# Altium integrated library WCAP-ATLL_rev15a.intlib: 209 symbols (part 2 of 3) (continued)
## WCAP-ATLL 8x16x3.5x0.5 860160574017
designator C?, comment 180 μF
WCAP-ATLL Aluminum Electrolytic Capacitors , 180 μF; + / - 20%; 35 V , 8 x 16; Manufacturer: Wurth Elektronik; partNo: 860160574017; E-mail: libraries@we-online.com; Characteristics: Aluminum Electrolytic Capacitor;Recommended soldering: Wave;Operating temperature: –55 °C to +105 °C;Low impedance and high temperature product series;Load life: 3000–10000 h @ +105 °C; ComponentLink1Description: Manufacturer; ComponentLink1URL: http://www.we-online.com; ComponentLink2Description: Datasheet; ComponentLink2URL: http://katalog.we-online.de/pbs/datasheet/860160574017.pdf; Created by: Karrer Zheng; Created Date: 5/13/2015; Capacitance: 180 μF; Application: Used in circuit with rigorous conditions and high ambient temperature;  applied to the secondary side output filtering loop, used in switching power supply with higher operating temperature, DC-DC converter, AC-DC converter, adapter, charger, TV, VCR, DC motor circuit filter, high-end switching power supply, LCD TV, energy saving lamps, electronic ballast, LED lamp and etc.
footprint WCAP-ATLL 8x16x3.5x0.5
pins: 1, 2

## WCAP-ATLL 8x16x3.5x0.5 860160574019
designator C?, comment 220 μF
WCAP-ATLL Aluminum Electrolytic Capacitors , 220 μF; + / - 20%; 35 V , 8 x 16; Manufacturer: Wurth Elektronik; partNo: 860160574019; E-mail: libraries@we-online.com; Characteristics: Aluminum Electrolytic Capacitor;Recommended soldering: Wave;Operating temperature: –55 °C to +105 °C;Low impedance and high temperature product series;Load life: 3000–10000 h @ +105 °C; ComponentLink1Description: Manufacturer; ComponentLink1URL: http://www.we-online.com; ComponentLink2Description: Datasheet; ComponentLink2URL: http://katalog.we-online.de/pbs/datasheet/860160574019.pdf; Created by: Karrer Zheng; Created Date: 5/13/2015; Capacitance: 220 μF; Application: Used in circuit with rigorous conditions and high ambient temperature;  applied to the secondary side output filtering loop, used in switching power supply with higher operating temperature, DC-DC converter, AC-DC converter, adapter, charger, TV, VCR, DC motor circuit filter, high-end switching power supply, LCD TV, energy saving lamps, electronic ballast, LED lamp and etc.
footprint WCAP-ATLL 8x16x3.5x0.5
pins: 1, 2

## WCAP-ATLL 8x20x3.5x0.6 860160574021
designator C?, comment 270 μF
WCAP-ATLL Aluminum Electrolytic Capacitors , 270 μF; + / - 20%; 35 V , 8 x 20; Manufacturer: Wurth Elektronik; partNo: 860160574021; E-mail: libraries@we-online.com; Characteristics: Aluminum Electrolytic Capacitor;Recommended soldering: Wave;Operating temperature: –55 °C to +105 °C;Low impedance and high temperature product series;Load life: 3000–10000 h @ +105 °C; ComponentLink1Description: Manufacturer; ComponentLink1URL: http://www.we-online.com; ComponentLink2Description: Datasheet; ComponentLink2URL: http://katalog.we-online.de/pbs/datasheet/860160574021.pdf; Created by: Karrer Zheng; Created Date: 5/13/2015; Capacitance: 270 μF; Application: Used in circuit with rigorous conditions and high ambient temperature;  applied to the secondary side output filtering loop, used in switching power supply with higher operating temperature, DC-DC converter, AC-DC converter, adapter, charger, TV, VCR, DC motor circuit filter, high-end switching power supply, LCD TV, energy saving lamps, electronic ballast, LED lamp and etc.
footprint WCAP-ATLL 8x20x3.5x0.6
pins: 1, 2

## WCAP-ATLL 8x20x3.5x0.6 860160574023
designator C?, comment 330 μF
WCAP-ATLL Aluminum Electrolytic Capacitors , 330 μF; + / - 20%; 35 V , 8 x 20; Manufacturer: Wurth Elektronik; partNo: 860160574023; E-mail: libraries@we-online.com; Characteristics: Aluminum Electrolytic Capacitor;Recommended soldering: Wave;Operating temperature: –55 °C to +105 °C;Low impedance and high temperature product series;Load life: 3000–10000 h @ +105 °C; ComponentLink1Description: Manufacturer; ComponentLink1URL: http://www.we-online.com; ComponentLink2Description: Datasheet; ComponentLink2URL: http://katalog.we-online.de/pbs/datasheet/860160574023.pdf; Created by: Karrer Zheng; Created Date: 5/13/2015; Capacitance: 330 μF; Application: Used in circuit with rigorous conditions and high ambient temperature;  applied to the secondary side output filtering loop, used in switching power supply with higher operating temperature, DC-DC converter, AC-DC converter, adapter, charger, TV, VCR, DC motor circuit filter, high-end switching power supply, LCD TV, energy saving lamps, electronic ballast, LED lamp and etc.
footprint WCAP-ATLL 8x20x3.5x0.6
pins: 1, 2

## WCAP-ATLL 10x12.5x5x0.6 860160575016
designator C?, comment 150 μF
WCAP-ATLL Aluminum Electrolytic Capacitors , 150 μF; + / - 20%; 35 V , 10 x 12,5; Manufacturer: Wurth Elektronik; partNo: 860160575016; E-mail: libraries@we-online.com; Characteristics: Aluminum Electrolytic Capacitor;Recommended soldering: Wave;Operating temperature: –55 °C to +105 °C;Low impedance and high temperature product series;Load life: 3000–10000 h @ +105 °C; ComponentLink1Description: Manufacturer; ComponentLink1URL: http://www.we-online.com; ComponentLink2Description: Datasheet; ComponentLink2URL: http://katalog.we-online.de/pbs/datasheet/860160575016.pdf; Created by: Karrer Zheng; Created Date: 5/13/2015; Capacitance: 150 μF; Application: Used in circuit with rigorous conditions and high ambient temperature;  applied to the secondary side output filtering loop, used in switching power supply with higher operating temperature, DC-DC converter, AC-DC converter, adapter, charger, TV, VCR, DC motor circuit filter, high-end switching power supply, LCD TV, energy saving lamps, electronic ballast, LED lamp and etc.
footprint WCAP-ATLL 10x12.5x5x0.6
pins: 1, 2

## WCAP-ATLL 10x12.5x5x0.6 860160575018
designator C?, comment 180 μF
WCAP-ATLL Aluminum Electrolytic Capacitors , 180 μF; + / - 20%; 35 V , 10 x 12,5; Manufacturer: Wurth Elektronik; partNo: 860160575018; E-mail: libraries@we-online.com; Characteristics: Aluminum Electrolytic Capacitor;Recommended soldering: Wave;Operating temperature: –55 °C to +105 °C;Low impedance and high temperature product series;Load life: 3000–10000 h @ +105 °C; ComponentLink1Description: Manufacturer; ComponentLink1URL: http://www.we-online.com; ComponentLink2Description: Datasheet; ComponentLink2URL: http://katalog.we-online.de/pbs/datasheet/860160575018.pdf; Created by: Karrer Zheng; Created Date: 5/13/2015; Capacitance: 180 μF; Application: Used in circuit with rigorous conditions and high ambient temperature;  applied to the secondary side output filtering loop, used in switching power supply with higher operating temperature, DC-DC converter, AC-DC converter, adapter, charger, TV, VCR, DC motor circuit filter, high-end switching power supply, LCD TV, energy saving lamps, electronic ballast, LED lamp and etc.
footprint WCAP-ATLL 10x12.5x5x0.6
pins: 1, 2

## WCAP-ATLL 10x12.5x5x0.6 860160575020
designator C?, comment 220 μF
WCAP-ATLL Aluminum Electrolytic Capacitors , 220 μF; + / - 20%; 35 V , 10 x 12,5; Manufacturer: Wurth Elektronik; partNo: 860160575020; E-mail: libraries@we-online.com; Characteristics: Aluminum Electrolytic Capacitor;Recommended soldering: Wave;Operating temperature: –55 °C to +105 °C;Low impedance and high temperature product series;Load life: 3000–10000 h @ +105 °C; ComponentLink1Description: Manufacturer; ComponentLink1URL: http://www.we-online.com; ComponentLink2Description: Datasheet; ComponentLink2URL: http://katalog.we-online.de/pbs/datasheet/860160575020.pdf; Created by: Karrer Zheng; Created Date: 5/13/2015; Capacitance: 220 μF; Application: Used in circuit with rigorous conditions and high ambient temperature;  applied to the secondary side output filtering loop, used in switching power supply with higher operating temperature, DC-DC converter, AC-DC converter, adapter, charger, TV, VCR, DC motor circuit filter, high-end switching power supply, LCD TV, energy saving lamps, electronic ballast, LED lamp and etc.
footprint WCAP-ATLL 10x12.5x5x0.6
pins: 1, 2

## WCAP-ATLL 10x12.5x5x0.6 860160575022
designator C?, comment 270 μF
WCAP-ATLL Aluminum Electrolytic Capacitors , 270 μF; + / - 20%; 35 V , 10 x 12,5; Manufacturer: Wurth Elektronik; partNo: 860160575022; E-mail: libraries@we-online.com; Characteristics: Aluminum Electrolytic Capacitor;Recommended soldering: Wave;Operating temperature: –55 °C to +105 °C;Low impedance and high temperature product series;Load life: 3000–10000 h @ +105 °C; ComponentLink1Description: Manufacturer; ComponentLink1URL: http://www.we-online.com; ComponentLink2Description: Datasheet; ComponentLink2URL: http://katalog.we-online.de/pbs/datasheet/860160575022.pdf; Created by: Karrer Zheng; Created Date: 5/13/2015; Capacitance: 270 μF; Application: Used in circuit with rigorous conditions and high ambient temperature;  applied to the secondary side output filtering loop, used in switching power supply with higher operating temperature, DC-DC converter, AC-DC converter, adapter, charger, TV, VCR, DC motor circuit filter, high-end switching power supply, LCD TV, energy saving lamps, electronic ballast, LED lamp and etc.
footprint WCAP-ATLL 10x12.5x5x0.6
pins: 1, 2

## WCAP-ATLL 10x16x5x0.6 860160575024
designator C?, comment 330 μF
WCAP-ATLL Aluminum Electrolytic Capacitors , 330 μF; + / - 20%; 35 V , 10 x 16; Manufacturer: Wurth Elektronik; partNo: 860160575024; E-mail: libraries@we-online.com; Characteristics: Aluminum Electrolytic Capacitor;Recommended soldering: Wave;Operating temperature: –55 °C to +105 °C;Low impedance and high temperature product series;Load life: 3000–10000 h @ +105 °C; ComponentLink1Description: Manufacturer; ComponentLink1URL: http://www.we-online.com; ComponentLink2Description: Datasheet; ComponentLink2URL: http://katalog.we-online.de/pbs/datasheet/860160575024.pdf; Created by: Karrer Zheng; Created Date: 5/13/2015; Capacitance: 330 μF; Application: Used in circuit with rigorous conditions and high ambient temperature;  applied to the secondary side output filtering loop, used in switching power supply with higher operating temperature, DC-DC converter, AC-DC converter, adapter, charger, TV, VCR, DC motor circuit filter, high-end switching power supply, LCD TV, energy saving lamps, electronic ballast, LED lamp and etc.
footprint WCAP-ATLL 10x16x5x0.6
pins: 1, 2

## WCAP-ATLL 10x20x5x0.6 860160575025
designator C?, comment 470 μF
WCAP-ATLL Aluminum Electrolytic Capacitors , 470 μF; + / - 20%; 35 V , 10 x 20; Manufacturer: Wurth Elektronik; partNo: 860160575025; E-mail: libraries@we-online.com; Characteristics: Aluminum Electrolytic Capacitor;Recommended soldering: Wave;Operating temperature: –55 °C to +105 °C;Low impedance and high temperature product series;Load life: 3000–10000 h @ +105 °C; ComponentLink1Description: Manufacturer; ComponentLink1URL: http://www.we-online.com; ComponentLink2Description: Datasheet; ComponentLink2URL: http://katalog.we-online.de/pbs/datasheet/860160575025.pdf; Created by: Karrer Zheng; Created Date: 5/13/2015; Capacitance: 470 μF; Application: Used in circuit with rigorous conditions and high ambient temperature;  applied to the secondary side output filtering loop, used in switching power supply with higher operating temperature, DC-DC converter, AC-DC converter, adapter, charger, TV, VCR, DC motor circuit filter, high-end switching power supply, LCD TV, energy saving lamps, electronic ballast, LED lamp and etc.
footprint WCAP-ATLL 10x20x5x0.6
pins: 1, 2

## WCAP-ATLL 10x25x5x0.6 860160575026
designator C?, comment 560 μF
WCAP-ATLL Aluminum Electrolytic Capacitors , 560 μF; + / - 20%; 35 V , 10 x 25; Manufacturer: Wurth Elektronik; partNo: 860160575026; E-mail: libraries@we-online.com; Characteristics: Aluminum Electrolytic Capacitor;Recommended soldering: Wave;Operating temperature: –55 °C to +105 °C;Low impedance and high temperature product series;Load life: 3000–10000 h @ +105 °C; ComponentLink1Description: Manufacturer; ComponentLink1URL: http://www.we-online.com; ComponentLink2Description: Datasheet; ComponentLink2URL: http://katalog.we-online.de/pbs/datasheet/860160575026.pdf; Created by: Karrer Zheng; Created Date: 5/13/2015; Capacitance: 560 μF; Application: Used in circuit with rigorous conditions and high ambient temperature;  applied to the secondary side output filtering loop, used in switching power supply with higher operating temperature, DC-DC converter, AC-DC converter, adapter, charger, TV, VCR, DC motor circuit filter, high-end switching power supply, LCD TV, energy saving lamps, electronic ballast, LED lamp and etc.
footprint WCAP-ATLL 10x25x5x0.6
pins: 1, 2

## WCAP-ATLL 10x25x5x0.6 860160575028
designator C?, comment 680 μF
WCAP-ATLL Aluminum Electrolytic Capacitors , 680 μF; + / - 20%; 35 V , 10 x 25; Manufacturer: Wurth Elektronik; partNo: 860160575028; E-mail: libraries@we-online.com; Characteristics: Aluminum Electrolytic Capacitor;Recommended soldering: Wave;Operating temperature: –55 °C to +105 °C;Low impedance and high temperature product series;Load life: 3000–10000 h @ +105 °C; ComponentLink1Description: Manufacturer; ComponentLink1URL: http://www.we-online.com; ComponentLink2Description: Datasheet; ComponentLink2URL: http://katalog.we-online.de/pbs/datasheet/860160575028.pdf; Created by: Karrer Zheng; Created Date: 5/13/2015; Capacitance: 680 μF; Application: Used in circuit with rigorous conditions and high ambient temperature;  applied to the secondary side output filtering loop, used in switching power supply with higher operating temperature, DC-DC converter, AC-DC converter, adapter, charger, TV, VCR, DC motor circuit filter, high-end switching power supply, LCD TV, energy saving lamps, electronic ballast, LED lamp and etc.
footprint WCAP-ATLL 10x25x5x0.6
pins: 1, 2

## WCAP-ATLL 10x30x5x0.6 860160575031
designator C?, comment 1000 μF
WCAP-ATLL Aluminum Electrolytic Capacitors , 1000 μF; + / - 20%; 35 V , 10 x 30; Manufacturer: Wurth Elektronik; partNo: 860160575031; E-mail: libraries@we-online.com; Characteristics: Aluminum Electrolytic Capacitor;Recommended soldering: Wave;Operating temperature: –55 °C to +105 °C;Low impedance and high temperature product series;Load life: 3000–10000 h @ +105 °C; ComponentLink1Description: Manufacturer; ComponentLink1URL: http://www.we-online.com; ComponentLink2Description: Datasheet; ComponentLink2URL: http://katalog.we-online.de/pbs/datasheet/860160575031.pdf; Created by: Karrer Zheng; Created Date: 5/13/2015; Capacitance: 1000 μF; Application: Used in circuit with rigorous conditions and high ambient temperature;  applied to the secondary side output filtering loop, used in switching power supply with higher operating temperature, DC-DC converter, AC-DC converter, adapter, charger, TV, VCR, DC motor circuit filter, high-end switching power supply, LCD TV, energy saving lamps, electronic ballast, LED lamp and etc.
footprint WCAP-ATLL 10x30x5x0.6
pins: 1, 2

## WCAP-ATLL 13x20x5x0.6 860160578027
designator C?, comment 560 μF
WCAP-ATLL Aluminum Electrolytic Capacitors , 560 μF; + / - 20%; 35 V , 13 x 20; Manufacturer: Wurth Elektronik; partNo: 860160578027; E-mail: libraries@we-online.com; Characteristics: Aluminum Electrolytic Capacitor;Recommended soldering: Wave;Operating temperature: –55 °C to +105 °C;Low impedance and high temperature product series;Load life: 3000–10000 h @ +105 °C; ComponentLink1Description: Manufacturer; ComponentLink1URL: http://www.we-online.com; ComponentLink2Description: Datasheet; ComponentLink2URL: http://katalog.we-online.de/pbs/datasheet/860160578027.pdf; Created by: Karrer Zheng; Created Date: 5/13/2015; Capacitance: 560 μF; Application: Used in circuit with rigorous conditions and high ambient temperature;  applied to the secondary side output filtering loop, used in switching power supply with higher operating temperature, DC-DC converter, AC-DC converter, adapter, charger, TV, VCR, DC motor circuit filter, high-end switching power supply, LCD TV, energy saving lamps, electronic ballast, LED lamp and etc.
footprint WCAP-ATLL 13x20x5x0.6
pins: 1, 2

## WCAP-ATLL 13x20x5x0.6 860160578029
designator C?, comment 680 μF
WCAP-ATLL Aluminum Electrolytic Capacitors , 680 μF; + / - 20%; 35 V , 13 x 20; Manufacturer: Wurth Elektronik; partNo: 860160578029; E-mail: libraries@we-online.com; Characteristics: Aluminum Electrolytic Capacitor;Recommended soldering: Wave;Operating temperature: –55 °C to +105 °C;Low impedance and high temperature product series;Load life: 3000–10000 h @ +105 °C; ComponentLink1Description: Manufacturer; ComponentLink1URL: http://www.we-online.com; ComponentLink2Description: Datasheet; ComponentLink2URL: http://katalog.we-online.de/pbs/datasheet/860160578029.pdf; Created by: Karrer Zheng; Created Date: 5/13/2015; Capacitance: 680 μF; Application: Used in circuit with rigorous conditions and high ambient temperature;  applied to the secondary side output filtering loop, used in switching power supply with higher operating temperature, DC-DC converter, AC-DC converter, adapter, charger, TV, VCR, DC motor circuit filter, high-end switching power supply, LCD TV, energy saving lamps, electronic ballast, LED lamp and etc.
footprint WCAP-ATLL 13x20x5x0.6
pins: 1, 2

## WCAP-ATLL 13x20x5x0.6 860160578030
designator C?, comment 820 μF
WCAP-ATLL Aluminum Electrolytic Capacitors , 820 μF; + / - 20%; 35 V , 13 x 20; Manufacturer: Wurth Elektronik; partNo: 860160578030; E-mail: libraries@we-online.com; Characteristics: Aluminum Electrolytic Capacitor;Recommended soldering: Wave;Operating temperature: –55 °C to +105 °C;Low impedance and high temperature product series;Load life: 3000–10000 h @ +105 °C; ComponentLink1Description: Manufacturer; ComponentLink1URL: http://www.we-online.com; ComponentLink2Description: Datasheet; ComponentLink2URL: http://katalog.we-online.de/pbs/datasheet/860160578030.pdf; Created by: Karrer Zheng; Created Date: 5/13/2015; Capacitance: 820 μF; Application: Used in circuit with rigorous conditions and high ambient temperature;  applied to the secondary side output filtering loop, used in switching power supply with higher operating temperature, DC-DC converter, AC-DC converter, adapter, charger, TV, VCR, DC motor circuit filter, high-end switching power supply, LCD TV, energy saving lamps, electronic ballast, LED lamp and etc.
footprint WCAP-ATLL 13x20x5x0.6
pins: 1, 2

## WCAP-ATLL 13x25x5x0.6 860160578032
designator C?, comment 1000 μF
WCAP-ATLL Aluminum Electrolytic Capacitors , 1000 μF; + / - 20%; 35 V , 13 x 25; Manufacturer: Wurth Elektronik; partNo: 860160578032; E-mail: libraries@we-online.com; Characteristics: Aluminum Electrolytic Capacitor;Recommended soldering: Wave;Operating temperature: –55 °C to +105 °C;Low impedance and high temperature product series;Load life: 3000–10000 h @ +105 °C; ComponentLink1Description: Manufacturer; ComponentLink1URL: http://www.we-online.com; ComponentLink2Description: Datasheet; ComponentLink2URL: http://katalog.we-online.de/pbs/datasheet/860160578032.pdf; Created by: Karrer Zheng; Created Date: 5/13/2015; Capacitance: 1000 μF; Application: Used in circuit with rigorous conditions and high ambient temperature;  applied to the secondary side output filtering loop, used in switching power supply with higher operating temperature, DC-DC converter, AC-DC converter, adapter, charger, TV, VCR, DC motor circuit filter, high-end switching power supply, LCD TV, energy saving lamps, electronic ballast, LED lamp and etc.
footprint WCAP-ATLL 13x25x5x0.6
pins: 1, 2

## WCAP-ATLL 13x25x5x0.6 860160578033
designator C?, comment 1200 μF
WCAP-ATLL Aluminum Electrolytic Capacitors , 1200 μF; + / - 20%; 35 V , 13 x 25; Manufacturer: Wurth Elektronik; partNo: 860160578033; E-mail: libraries@we-online.com; Characteristics: Aluminum Electrolytic Capacitor;Recommended soldering: Wave;Operating temperature: –55 °C to +105 °C;Low impedance and high temperature product series;Load life: 3000–10000 h @ +105 °C; ComponentLink1Description: Manufacturer; ComponentLink1URL: http://www.we-online.com; ComponentLink2Description: Datasheet; ComponentLink2URL: http://katalog.we-online.de/pbs/datasheet/860160578033.pdf; Created by: Karrer Zheng; Created Date: 5/13/2015; Capacitance: 1200 μF; Application: Used in circuit with rigorous conditions and high ambient temperature;  applied to the secondary side output filtering loop, used in switching power supply with higher operating temperature, DC-DC converter, AC-DC converter, adapter, charger, TV, VCR, DC motor circuit filter, high-end switching power supply, LCD TV, energy saving lamps, electronic ballast, LED lamp and etc.
footprint WCAP-ATLL 13x25x5x0.6
pins: 1, 2

## WCAP-ATLL 13x35x5x0.6 860160578034
designator C?, comment 1500 μF
WCAP-ATLL Aluminum Electrolytic Capacitors , 1500 μF; + / - 20%; 35 V , 13 x 35; Manufacturer: Wurth Elektronik; partNo: 860160578034; E-mail: libraries@we-online.com; Characteristics: Aluminum Electrolytic Capacitor;Recommended soldering: Wave;Operating temperature: –55 °C to +105 °C;Low impedance and high temperature product series;Load life: 3000–10000 h @ +105 °C; ComponentLink1Description: Manufacturer; ComponentLink1URL: http://www.we-online.com; ComponentLink2Description: Datasheet; ComponentLink2URL: http://katalog.we-online.de/pbs/datasheet/860160578034.pdf; Created by: Karrer Zheng; Created Date: 5/13/2015; Capacitance: 1500 μF; Application: Used in circuit with rigorous conditions and high ambient temperature;  applied to the secondary side output filtering loop, used in switching power supply with higher operating temperature, DC-DC converter, AC-DC converter, adapter, charger, TV, VCR, DC motor circuit filter, high-end switching power supply, LCD TV, energy saving lamps, electronic ballast, LED lamp and etc.
footprint WCAP-ATLL 13x35x5x0.6
pins: 1, 2

## WCAP-ATLL 13x35x5x0.6 860160578036
designator C?, comment 1800 μF
WCAP-ATLL Aluminum Electrolytic Capacitors , 1800 μF; + / - 20%; 35 V , 13 x 35; Manufacturer: Wurth Elektronik; partNo: 860160578036; E-mail: libraries@we-online.com; Characteristics: Aluminum Electrolytic Capacitor;Recommended soldering: Wave;Operating temperature: –55 °C to +105 °C;Low impedance and high temperature product series;Load life: 3000–10000 h @ +105 °C; ComponentLink1Description: Manufacturer; ComponentLink1URL: http://www.we-online.com; ComponentLink2Description: Datasheet; ComponentLink2URL: http://katalog.we-online.de/pbs/datasheet/860160578036.pdf; Created by: Karrer Zheng; Created Date: 5/13/2015; Capacitance: 1800 μF; Application: Used in circuit with rigorous conditions and high ambient temperature;  applied to the secondary side output filtering loop, used in switching power supply with higher operating temperature, DC-DC converter, AC-DC converter, adapter, charger, TV, VCR, DC motor circuit filter, high-end switching power supply, LCD TV, energy saving lamps, electronic ballast, LED lamp and etc.
footprint WCAP-ATLL 13x35x5x0.6
pins: 1, 2

## WCAP-ATLL 16x31.5x7.5x0.8 860160580035
designator C?, comment 1500 μF
WCAP-ATLL Aluminum Electrolytic Capacitors , 1500 μF; + / - 20%; 35 V , 16 x 31,5; Manufacturer: Wurth Elektronik; partNo: 860160580035; E-mail: libraries@we-online.com; Characteristics: Aluminum Electrolytic Capacitor;Recommended soldering: Wave;Operating temperature: –55 °C to +105 °C;Low impedance and high temperature product series;Load life: 3000–10000 h @ +105 °C; ComponentLink1Description: Manufacturer; ComponentLink1URL: http://www.we-online.com; ComponentLink2Description: Datasheet; ComponentLink2URL: http://katalog.we-online.de/pbs/datasheet/860160580035.pdf; Created by: Karrer Zheng; Created Date: 5/13/2015; Capacitance: 1500 μF; Application: Used in circuit with rigorous conditions and high ambient temperature;  applied to the secondary side output filtering loop, used in switching power supply with higher operating temperature, DC-DC converter, AC-DC converter, adapter, charger, TV, VCR, DC motor circuit filter, high-end switching power supply, LCD TV, energy saving lamps, electronic ballast, LED lamp and etc.
footprint WCAP-ATLL 16x31.5x7.5x0.8
pins: 1, 2

## WCAP-ATLL 16x31.5x7.5x0.8 860160580037
designator C?, comment 1800 μF
WCAP-ATLL Aluminum Electrolytic Capacitors , 1800 μF; + / - 20%; 35 V , 16 x 31,5; Manufacturer: Wurth Elektronik; partNo: 860160580037; E-mail: libraries@we-online.com; Characteristics: Aluminum Electrolytic Capacitor;Recommended soldering: Wave;Operating temperature: –55 °C to +105 °C;Low impedance and high temperature product series;Load life: 3000–10000 h @ +105 °C; ComponentLink1Description: Manufacturer; ComponentLink1URL: http://www.we-online.com; ComponentLink2Description: Datasheet; ComponentLink2URL: http://katalog.we-online.de/pbs/datasheet/860160580037.pdf; Created by: Karrer Zheng; Created Date: 5/13/2015; Capacitance: 1800 μF; Application: Used in circuit with rigorous conditions and high ambient temperature;  applied to the secondary side output filtering loop, used in switching power supply with higher operating temperature, DC-DC converter, AC-DC converter, adapter, charger, TV, VCR, DC motor circuit filter, high-end switching power supply, LCD TV, energy saving lamps, electronic ballast, LED lamp and etc.
footprint WCAP-ATLL 16x31.5x7.5x0.8
pins: 1, 2

## WCAP-ATLL 16x31.5x7.5x0.8 860160580038
designator C?, comment 2200 μF
WCAP-ATLL Aluminum Electrolytic Capacitors , 2200 μF; + / - 20%; 35 V , 16 x 31,5; Manufacturer: Wurth Elektronik; partNo: 860160580038; E-mail: libraries@we-online.com; Characteristics: Aluminum Electrolytic Capacitor;Recommended soldering: Wave;Operating temperature: –55 °C to +105 °C;Low impedance and high temperature product series;Load life: 3000–10000 h @ +105 °C; ComponentLink1Description: Manufacturer; ComponentLink1URL: http://www.we-online.com; ComponentLink2Description: Datasheet; ComponentLink2URL: http://katalog.we-online.de/pbs/datasheet/860160580038.pdf; Created by: Karrer Zheng; Created Date: 5/13/2015; Capacitance: 2200 μF; Application: Used in circuit with rigorous conditions and high ambient temperature;  applied to the secondary side output filtering loop, used in switching power supply with higher operating temperature, DC-DC converter, AC-DC converter, adapter, charger, TV, VCR, DC motor circuit filter, high-end switching power supply, LCD TV, energy saving lamps, electronic ballast, LED lamp and etc.
footprint WCAP-ATLL 16x31.5x7.5x0.8
pins: 1, 2

## WCAP-ATLL 18x25x7.5x0.8 860160581039
designator C?, comment 2200 μF
WCAP-ATLL Aluminum Electrolytic Capacitors , 2200 μF; + / - 20%; 35 V , 18 x 25; Manufacturer: Wurth Elektronik; partNo: 860160581039; E-mail: libraries@we-online.com; Characteristics: Aluminum Electrolytic Capacitor;Recommended soldering: Wave;Operating temperature: –55 °C to +105 °C;Low impedance and high temperature product series;Load life: 3000–10000 h @ +105 °C; ComponentLink1Description: Manufacturer; ComponentLink1URL: http://www.we-online.com; ComponentLink2Description: Datasheet; ComponentLink2URL: http://katalog.we-online.de/pbs/datasheet/860160581039.pdf; Created by: Karrer Zheng; Created Date: 5/13/2015; Capacitance: 2200 μF; Application: Used in circuit with rigorous conditions and high ambient temperature;  applied to the secondary side output filtering loop, used in switching power supply with higher operating temperature, DC-DC converter, AC-DC converter, adapter, charger, TV, VCR, DC motor circuit filter, high-end switching power supply, LCD TV, energy saving lamps, electronic ballast, LED lamp and etc.
footprint WCAP-ATLL 18x25x7.5x0.8
pins: 1, 2

## WCAP-ATLL 18x31.5x7.5x0.8 860160581040
designator C?, comment 2700 μF
WCAP-ATLL Aluminum Electrolytic Capacitors , 2700 μF; + / - 20%; 35 V , 18 x 31,5; Manufacturer: Wurth Elektronik; partNo: 860160581040; E-mail: libraries@we-online.com; Characteristics: Aluminum Electrolytic Capacitor;Recommended soldering: Wave;Operating temperature: –55 °C to +105 °C;Low impedance and high temperature product series;Load life: 3000–10000 h @ +105 °C; ComponentLink1Description: Manufacturer; ComponentLink1URL: http://www.we-online.com; ComponentLink2Description: Datasheet; ComponentLink2URL: http://katalog.we-online.de/pbs/datasheet/860160581040.pdf; Created by: Karrer Zheng; Created Date: 5/13/2015; Capacitance: 2700 μF; Application: Used in circuit with rigorous conditions and high ambient temperature;  applied to the secondary side output filtering loop, used in switching power supply with higher operating temperature, DC-DC converter, AC-DC converter, adapter, charger, TV, VCR, DC motor circuit filter, high-end switching power supply, LCD TV, energy saving lamps, electronic ballast, LED lamp and etc.
footprint WCAP-ATLL 18x31.5x7.5x0.8
pins: 1, 2


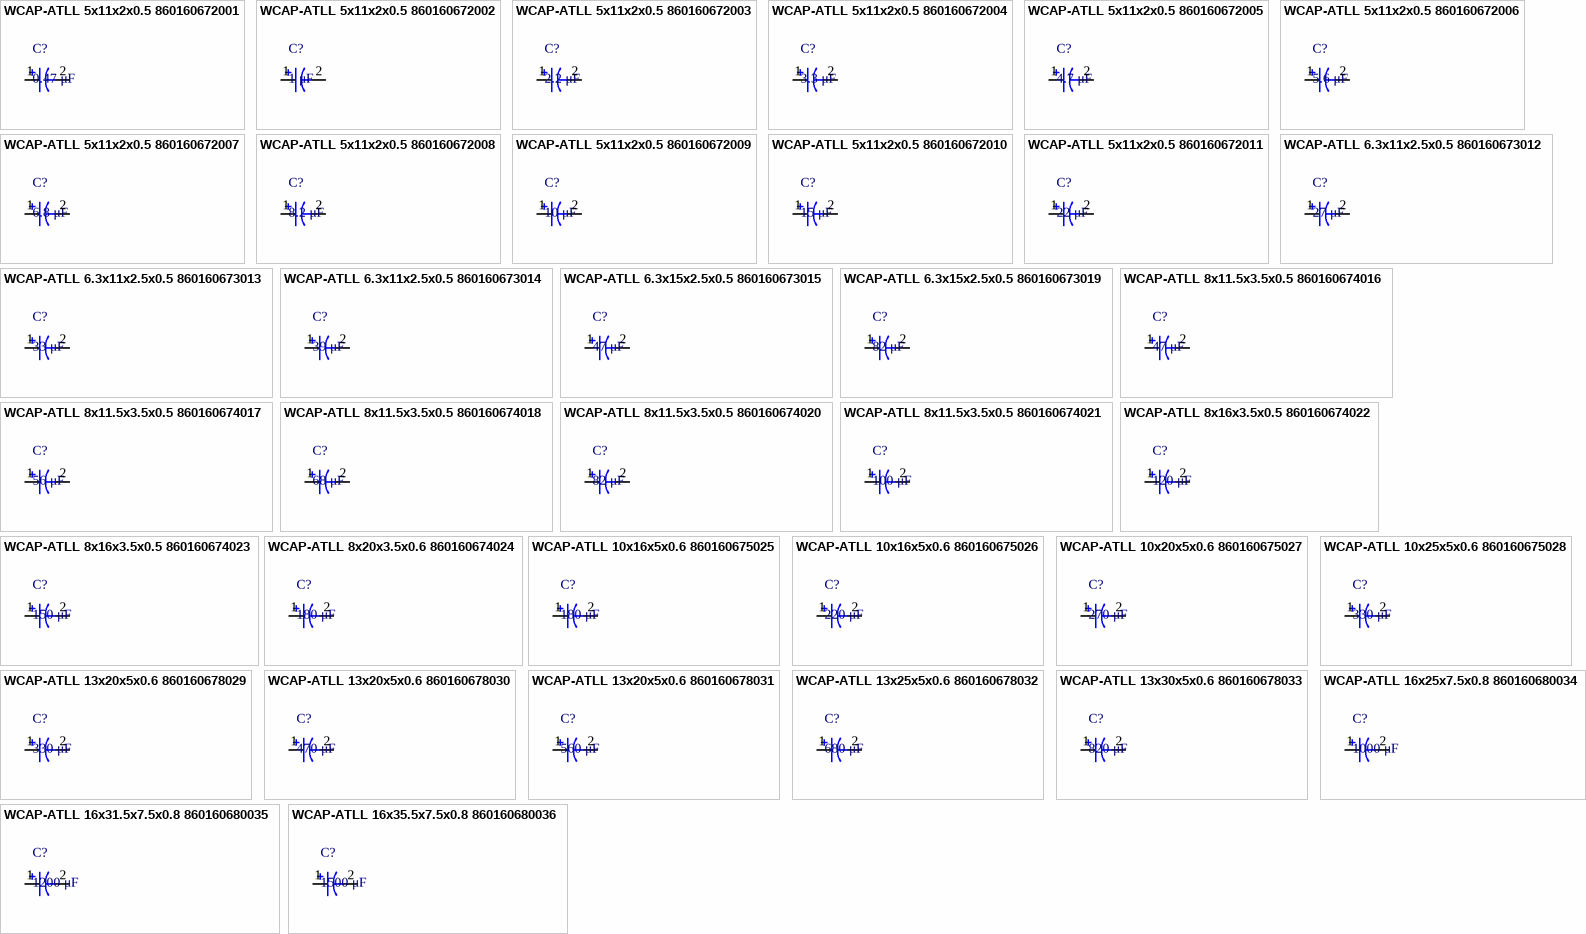
[diagram p6: symbols WCAP-ATLL 5x11x2x0.5 860160672001 to WCAP-ATLL 16x35.5x7.5x0.8 860160680036]

## WCAP-ATLL 5x11x2x0.5 860160672001
designator C?, comment 0.47 μF
WCAP-ATLL Aluminum Electrolytic Capacitors , 0,47 μF; + / - 20%; 50 V , 5 x 11; Manufacturer: Wurth Elektronik; partNo: 860160672001; E-mail: libraries@we-online.com; Characteristics: Aluminum Electrolytic Capacitor;Recommended soldering: Wave;Operating temperature: –55 °C to +105 °C;Low impedance and high temperature product series;Load life: 3000–10000 h @ +105 °C; ComponentLink1Description: Manufacturer; ComponentLink1URL: http://www.we-online.com; ComponentLink2Description: Datasheet; ComponentLink2URL: http://katalog.we-online.de/pbs/datasheet/860160672001.pdf; Created by: Karrer Zheng; Created Date: 5/13/2015; Capacitance: 0.47 μF; Application: Used in circuit with rigorous conditions and high ambient temperature;  applied to the secondary side output filtering loop, used in switching power supply with higher operating temperature, DC-DC converter, AC-DC converter, adapter, charger, TV, VCR, DC motor circuit filter, high-end switching power supply, LCD TV, energy saving lamps, electronic ballast, LED lamp and etc.
footprint WCAP-ATLL 5x11x2x0.5
pins: 1, 2

## WCAP-ATLL 5x11x2x0.5 860160672002
designator C?, comment 1 μF
WCAP-ATLL Aluminum Electrolytic Capacitors , 1 μF; + / - 20%; 50 V , 5 x 11; Manufacturer: Wurth Elektronik; partNo: 860160672002; E-mail: libraries@we-online.com; Characteristics: Aluminum Electrolytic Capacitor;Recommended soldering: Wave;Operating temperature: –55 °C to +105 °C;Low impedance and high temperature product series;Load life: 3000–10000 h @ +105 °C; ComponentLink1Description: Manufacturer; ComponentLink1URL: http://www.we-online.com; ComponentLink2Description: Datasheet; ComponentLink2URL: http://katalog.we-online.de/pbs/datasheet/860160672002.pdf; Created by: Karrer Zheng; Created Date: 5/13/2015; Capacitance: 1 μF; Application: Used in circuit with rigorous conditions and high ambient temperature;  applied to the secondary side output filtering loop, used in switching power supply with higher operating temperature, DC-DC converter, AC-DC converter, adapter, charger, TV, VCR, DC motor circuit filter, high-end switching power supply, LCD TV, energy saving lamps, electronic ballast, LED lamp and etc.
footprint WCAP-ATLL 5x11x2x0.5
pins: 1, 2

## WCAP-ATLL 5x11x2x0.5 860160672003
designator C?, comment 2.2 μF
WCAP-ATLL Aluminum Electrolytic Capacitors , 2,2 μF; + / - 20%; 50 V , 5 x 11; Manufacturer: Wurth Elektronik; partNo: 860160672003; E-mail: libraries@we-online.com; Characteristics: Aluminum Electrolytic Capacitor;Recommended soldering: Wave;Operating temperature: –55 °C to +105 °C;Low impedance and high temperature product series;Load life: 3000–10000 h @ +105 °C; ComponentLink1Description: Manufacturer; ComponentLink1URL: http://www.we-online.com; ComponentLink2Description: Datasheet; ComponentLink2URL: http://katalog.we-online.de/pbs/datasheet/860160672003.pdf; Created by: Karrer Zheng; Created Date: 5/13/2015; Capacitance: 2.2 μF; Application: Used in circuit with rigorous conditions and high ambient temperature;  applied to the secondary side output filtering loop, used in switching power supply with higher operating temperature, DC-DC converter, AC-DC converter, adapter, charger, TV, VCR, DC motor circuit filter, high-end switching power supply, LCD TV, energy saving lamps, electronic ballast, LED lamp and etc.
footprint WCAP-ATLL 5x11x2x0.5
pins: 1, 2

## WCAP-ATLL 5x11x2x0.5 860160672004
designator C?, comment 3.3 μF
WCAP-ATLL Aluminum Electrolytic Capacitors , 3,3 μF; + / - 20%; 50 V , 5 x 11; Manufacturer: Wurth Elektronik; partNo: 860160672004; E-mail: libraries@we-online.com; Characteristics: Aluminum Electrolytic Capacitor;Recommended soldering: Wave;Operating temperature: –55 °C to +105 °C;Low impedance and high temperature product series;Load life: 3000–10000 h @ +105 °C; ComponentLink1Description: Manufacturer; ComponentLink1URL: http://www.we-online.com; ComponentLink2Description: Datasheet; ComponentLink2URL: http://katalog.we-online.de/pbs/datasheet/860160672004.pdf; Created by: Karrer Zheng; Created Date: 5/13/2015; Capacitance: 3.3 μF; Application: Used in circuit with rigorous conditions and high ambient temperature;  applied to the secondary side output filtering loop, used in switching power supply with higher operating temperature, DC-DC converter, AC-DC converter, adapter, charger, TV, VCR, DC motor circuit filter, high-end switching power supply, LCD TV, energy saving lamps, electronic ballast, LED lamp and etc.
footprint WCAP-ATLL 5x11x2x0.5
pins: 1, 2

## WCAP-ATLL 5x11x2x0.5 860160672005
designator C?, comment 4.7 μF
WCAP-ATLL Aluminum Electrolytic Capacitors , 4,7 μF; + / - 20%; 50 V , 5 x 11; Manufacturer: Wurth Elektronik; partNo: 860160672005; E-mail: libraries@we-online.com; Characteristics: Aluminum Electrolytic Capacitor;Recommended soldering: Wave;Operating temperature: –55 °C to +105 °C;Low impedance and high temperature product series;Load life: 3000–10000 h @ +105 °C; ComponentLink1Description: Manufacturer; ComponentLink1URL: http://www.we-online.com; ComponentLink2Description: Datasheet; ComponentLink2URL: http://katalog.we-online.de/pbs/datasheet/860160672005.pdf; Created by: Karrer Zheng; Created Date: 5/13/2015; Capacitance: 4.7 μF; Application: Used in circuit with rigorous conditions and high ambient temperature;  applied to the secondary side output filtering loop, used in switching power supply with higher operating temperature, DC-DC converter, AC-DC converter, adapter, charger, TV, VCR, DC motor circuit filter, high-end switching power supply, LCD TV, energy saving lamps, electronic ballast, LED lamp and etc.
footprint WCAP-ATLL 5x11x2x0.5
pins: 1, 2

## WCAP-ATLL 5x11x2x0.5 860160672006
designator C?, comment 5.6 μF
WCAP-ATLL Aluminum Electrolytic Capacitors , 5,6 μF; + / - 20%; 50 V , 5 x 11; Manufacturer: Wurth Elektronik; partNo: 860160672006; E-mail: libraries@we-online.com; Characteristics: Aluminum Electrolytic Capacitor;Recommended soldering: Wave;Operating temperature: –55 °C to +105 °C;Low impedance and high temperature product series;Load life: 3000–10000 h @ +105 °C; ComponentLink1Description: Manufacturer; ComponentLink1URL: http://www.we-online.com; ComponentLink2Description: Datasheet; ComponentLink2URL: http://katalog.we-online.de/pbs/datasheet/860160672006.pdf; Created by: Karrer Zheng; Created Date: 5/13/2015; Capacitance: 5.6 μF; Application: Used in circuit with rigorous conditions and high ambient temperature;  applied to the secondary side output filtering loop, used in switching power supply with higher operating temperature, DC-DC converter, AC-DC converter, adapter, charger, TV, VCR, DC motor circuit filter, high-end switching power supply, LCD TV, energy saving lamps, electronic ballast, LED lamp and etc.
footprint WCAP-ATLL 5x11x2x0.5
pins: 1, 2

## WCAP-ATLL 5x11x2x0.5 860160672007
designator C?, comment 6.8 μF
WCAP-ATLL Aluminum Electrolytic Capacitors , 6,8 μF; + / - 20%; 50 V , 5 x 11; Manufacturer: Wurth Elektronik; partNo: 860160672007; E-mail: libraries@we-online.com; Characteristics: Aluminum Electrolytic Capacitor;Recommended soldering: Wave;Operating temperature: –55 °C to +105 °C;Low impedance and high temperature product series;Load life: 3000–10000 h @ +105 °C; ComponentLink1Description: Manufacturer; ComponentLink1URL: http://www.we-online.com; ComponentLink2Description: Datasheet; ComponentLink2URL: http://katalog.we-online.de/pbs/datasheet/860160672007.pdf; Created by: Karrer Zheng; Created Date: 5/13/2015; Capacitance: 6.8 μF; Application: Used in circuit with rigorous conditions and high ambient temperature;  applied to the secondary side output filtering loop, used in switching power supply with higher operating temperature, DC-DC converter, AC-DC converter, adapter, charger, TV, VCR, DC motor circuit filter, high-end switching power supply, LCD TV, energy saving lamps, electronic ballast, LED lamp and etc.
footprint WCAP-ATLL 5x11x2x0.5
pins: 1, 2

## WCAP-ATLL 5x11x2x0.5 860160672008
designator C?, comment 8.2 μF
WCAP-ATLL Aluminum Electrolytic Capacitors , 8,2 μF; + / - 20%; 50 V , 5 x 11; Manufacturer: Wurth Elektronik; partNo: 860160672008; E-mail: libraries@we-online.com; Characteristics: Aluminum Electrolytic Capacitor;Recommended soldering: Wave;Operating temperature: –55 °C to +105 °C;Low impedance and high temperature product series;Load life: 3000–10000 h @ +105 °C; ComponentLink1Description: Manufacturer; ComponentLink1URL: http://www.we-online.com; ComponentLink2Description: Datasheet; ComponentLink2URL: http://katalog.we-online.de/pbs/datasheet/860160672008.pdf; Created by: Karrer Zheng; Created Date: 5/13/2015; Capacitance: 8.2 μF; Application: Used in circuit with rigorous conditions and high ambient temperature;  applied to the secondary side output filtering loop, used in switching power supply with higher operating temperature, DC-DC converter, AC-DC converter, adapter, charger, TV, VCR, DC motor circuit filter, high-end switching power supply, LCD TV, energy saving lamps, electronic ballast, LED lamp and etc.
footprint WCAP-ATLL 5x11x2x0.5
pins: 1, 2

## WCAP-ATLL 5x11x2x0.5 860160672009
designator C?, comment 10 μF
WCAP-ATLL Aluminum Electrolytic Capacitors , 10 μF; + / - 20%; 50 V , 5 x 11; Manufacturer: Wurth Elektronik; partNo: 860160672009; E-mail: libraries@we-online.com; Characteristics: Aluminum Electrolytic Capacitor;Recommended soldering: Wave;Operating temperature: –55 °C to +105 °C;Low impedance and high temperature product series;Load life: 3000–10000 h @ +105 °C; ComponentLink1Description: Manufacturer; ComponentLink1URL: http://www.we-online.com; ComponentLink2Description: Datasheet; ComponentLink2URL: http://katalog.we-online.de/pbs/datasheet/860160672009.pdf; Created by: Karrer Zheng; Created Date: 5/13/2015; Capacitance: 10 μF; Application: Used in circuit with rigorous conditions and high ambient temperature;  applied to the secondary side output filtering loop, used in switching power supply with higher operating temperature, DC-DC converter, AC-DC converter, adapter, charger, TV, VCR, DC motor circuit filter, high-end switching power supply, LCD TV, energy saving lamps, electronic ballast, LED lamp and etc.
footprint WCAP-ATLL 5x11x2x0.5
pins: 1, 2

## WCAP-ATLL 5x11x2x0.5 860160672010
designator C?, comment 15 μF
WCAP-ATLL Aluminum Electrolytic Capacitors , 15 μF; + / - 20%; 50 V , 5 x 11; Manufacturer: Wurth Elektronik; partNo: 860160672010; E-mail: libraries@we-online.com; Characteristics: Aluminum Electrolytic Capacitor;Recommended soldering: Wave;Operating temperature: –55 °C to +105 °C;Low impedance and high temperature product series;Load life: 3000–10000 h @ +105 °C; ComponentLink1Description: Manufacturer; ComponentLink1URL: http://www.we-online.com; ComponentLink2Description: Datasheet; ComponentLink2URL: http://katalog.we-online.de/pbs/datasheet/860160672010.pdf; Created by: Karrer Zheng; Created Date: 5/13/2015; Capacitance: 15 μF; Application: Used in circuit with rigorous conditions and high ambient temperature;  applied to the secondary side output filtering loop, used in switching power supply with higher operating temperature, DC-DC converter, AC-DC converter, adapter, charger, TV, VCR, DC motor circuit filter, high-end switching power supply, LCD TV, energy saving lamps, electronic ballast, LED lamp and etc.
footprint WCAP-ATLL 5x11x2x0.5
pins: 1, 2

## WCAP-ATLL 5x11x2x0.5 860160672011
designator C?, comment 22 μF
WCAP-ATLL Aluminum Electrolytic Capacitors , 22 μF; + / - 20%; 50 V , 5 x 11; Manufacturer: Wurth Elektronik; partNo: 860160672011; E-mail: libraries@we-online.com; Characteristics: Aluminum Electrolytic Capacitor;Recommended soldering: Wave;Operating temperature: –55 °C to +105 °C;Low impedance and high temperature product series;Load life: 3000–10000 h @ +105 °C; ComponentLink1Description: Manufacturer; ComponentLink1URL: http://www.we-online.com; ComponentLink2Description: Datasheet; ComponentLink2URL: http://katalog.we-online.de/pbs/datasheet/860160672011.pdf; Created by: Karrer Zheng; Created Date: 5/13/2015; Capacitance: 22 μF; Application: Used in circuit with rigorous conditions and high ambient temperature;  applied to the secondary side output filtering loop, used in switching power supply with higher operating temperature, DC-DC converter, AC-DC converter, adapter, charger, TV, VCR, DC motor circuit filter, high-end switching power supply, LCD TV, energy saving lamps, electronic ballast, LED lamp and etc.
footprint WCAP-ATLL 5x11x2x0.5
pins: 1, 2

## WCAP-ATLL 6.3x11x2.5x0.5 860160673012
designator C?, comment 27 μF
WCAP-ATLL Aluminum Electrolytic Capacitors , 27 μF; + / - 20%; 50 V , 6,3 x 11; Manufacturer: Wurth Elektronik; partNo: 860160673012; E-mail: libraries@we-online.com; Characteristics: Aluminum Electrolytic Capacitor;Recommended soldering: Wave;Operating temperature: –55 °C to +105 °C;Low impedance and high temperature product series;Load life: 3000–10000 h @ +105 °C; ComponentLink1Description: Manufacturer; ComponentLink1URL: http://www.we-online.com; ComponentLink2Description: Datasheet; ComponentLink2URL: http://katalog.we-online.de/pbs/datasheet/860160673012.pdf; Created by: Karrer Zheng; Created Date: 5/13/2015; Capacitance: 27 μF; Application: Used in circuit with rigorous conditions and high ambient temperature;  applied to the secondary side output filtering loop, used in switching power supply with higher operating temperature, DC-DC converter, AC-DC converter, adapter, charger, TV, VCR, DC motor circuit filter, high-end switching power supply, LCD TV, energy saving lamps, electronic ballast, LED lamp and etc.
footprint WCAP-ATLL 6.3x11x2.5x0.5
pins: 1, 2

## WCAP-ATLL 6.3x11x2.5x0.5 860160673013
designator C?, comment 33 μF
WCAP-ATLL Aluminum Electrolytic Capacitors , 33 μF; + / - 20%; 50 V , 6,3 x 11; Manufacturer: Wurth Elektronik; partNo: 860160673013; E-mail: libraries@we-online.com; Characteristics: Aluminum Electrolytic Capacitor;Recommended soldering: Wave;Operating temperature: –55 °C to +105 °C;Low impedance and high temperature product series;Load life: 3000–10000 h @ +105 °C; ComponentLink1Description: Manufacturer; ComponentLink1URL: http://www.we-online.com; ComponentLink2Description: Datasheet; ComponentLink2URL: http://katalog.we-online.de/pbs/datasheet/860160673013.pdf; Created by: Karrer Zheng; Created Date: 5/13/2015; Capacitance: 33 μF; Application: Used in circuit with rigorous conditions and high ambient temperature;  applied to the secondary side output filtering loop, used in switching power supply with higher operating temperature, DC-DC converter, AC-DC converter, adapter, charger, TV, VCR, DC motor circuit filter, high-end switching power supply, LCD TV, energy saving lamps, electronic ballast, LED lamp and etc.
footprint WCAP-ATLL 6.3x11x2.5x0.5
pins: 1, 2

## WCAP-ATLL 6.3x11x2.5x0.5 860160673014
designator C?, comment 39 μF
WCAP-ATLL Aluminum Electrolytic Capacitors , 39 μF; + / - 20%; 50 V , 6,3 x 11; Manufacturer: Wurth Elektronik; partNo: 860160673014; E-mail: libraries@we-online.com; Characteristics: Aluminum Electrolytic Capacitor;Recommended soldering: Wave;Operating temperature: –55 °C to +105 °C;Low impedance and high temperature product series;Load life: 3000–10000 h @ +105 °C; ComponentLink1Description: Manufacturer; ComponentLink1URL: http://www.we-online.com; ComponentLink2Description: Datasheet; ComponentLink2URL: http://katalog.we-online.de/pbs/datasheet/860160673014.pdf; Created by: Karrer Zheng; Created Date: 5/13/2015; Capacitance: 39 μF; Application: Used in circuit with rigorous conditions and high ambient temperature;  applied to the secondary side output filtering loop, used in switching power supply with higher operating temperature, DC-DC converter, AC-DC converter, adapter, charger, TV, VCR, DC motor circuit filter, high-end switching power supply, LCD TV, energy saving lamps, electronic ballast, LED lamp and etc.
footprint WCAP-ATLL 6.3x11x2.5x0.5
pins: 1, 2

## WCAP-ATLL 6.3x15x2.5x0.5 860160673015
designator C?, comment 47 μF
WCAP-ATLL Aluminum Electrolytic Capacitors , 47 μF; + / - 20%; 50 V , 6,3 x 15; Manufacturer: Wurth Elektronik; partNo: 860160673015; E-mail: libraries@we-online.com; Characteristics: Aluminum Electrolytic Capacitor;Recommended soldering: Wave;Operating temperature: –55 °C to +105 °C;Low impedance and high temperature product series;Load life: 3000–10000 h @ +105 °C; ComponentLink1Description: Manufacturer; ComponentLink1URL: http://www.we-online.com; ComponentLink2Description: Datasheet; ComponentLink2URL: http://katalog.we-online.de/pbs/datasheet/860160673015.pdf; Created by: Karrer Zheng; Created Date: 5/13/2015; Capacitance: 47 μF; Application: Used in circuit with rigorous conditions and high ambient temperature;  applied to the secondary side output filtering loop, used in switching power supply with higher operating temperature, DC-DC converter, AC-DC converter, adapter, charger, TV, VCR, DC motor circuit filter, high-end switching power supply, LCD TV, energy saving lamps, electronic ballast, LED lamp and etc.
footprint WCAP-ATLL 6.3x15x2.5x0.5
pins: 1, 2

## WCAP-ATLL 6.3x15x2.5x0.5 860160673019
designator C?, comment 82 μF
WCAP-ATLL Aluminum Electrolytic Capacitors , 82 μF; + / - 20%; 50 V , 6,3 x 15; Manufacturer: Wurth Elektronik; partNo: 860160673019; E-mail: libraries@we-online.com; Characteristics: Aluminum Electrolytic Capacitor;Recommended soldering: Wave;Operating temperature: –55 °C to +105 °C;Low impedance and high temperature product series;Load life: 3000–10000 h @ +105 °C; ComponentLink1Description: Manufacturer; ComponentLink1URL: http://www.we-online.com; ComponentLink2Description: Datasheet; ComponentLink2URL: http://katalog.we-online.de/pbs/datasheet/860160673019.pdf; Created by: Karrer Zheng; Created Date: 5/13/2015; Capacitance: 82 μF; Application: Used in circuit with rigorous conditions and high ambient temperature;  applied to the secondary side output filtering loop, used in switching power supply with higher operating temperature, DC-DC converter, AC-DC converter, adapter, charger, TV, VCR, DC motor circuit filter, high-end switching power supply, LCD TV, energy saving lamps, electronic ballast, LED lamp and etc.
footprint WCAP-ATLL 6.3x15x2.5x0.5
pins: 1, 2

## WCAP-ATLL 8x11.5x3.5x0.5 860160674016
designator C?, comment 47 μF
WCAP-ATLL Aluminum Electrolytic Capacitors , 47 μF; + / - 20%; 50 V , 8 x 11,5; Manufacturer: Wurth Elektronik; partNo: 860160674016; E-mail: libraries@we-online.com; Characteristics: Aluminum Electrolytic Capacitor;Recommended soldering: Wave;Operating temperature: –55 °C to +105 °C;Low impedance and high temperature product series;Load life: 3000–10000 h @ +105 °C; ComponentLink1Description: Manufacturer; ComponentLink1URL: http://www.we-online.com; ComponentLink2Description: Datasheet; ComponentLink2URL: http://katalog.we-online.de/pbs/datasheet/860160674016.pdf; Created by: Karrer Zheng; Created Date: 5/13/2015; Capacitance: 47 μF; Application: Used in circuit with rigorous conditions and high ambient temperature;  applied to the secondary side output filtering loop, used in switching power supply with higher operating temperature, DC-DC converter, AC-DC converter, adapter, charger, TV, VCR, DC motor circuit filter, high-end switching power supply, LCD TV, energy saving lamps, electronic ballast, LED lamp and etc.
footprint WCAP-ATLL 8x11.5x3.5x0.5
pins: 1, 2

## WCAP-ATLL 8x11.5x3.5x0.5 860160674017
designator C?, comment 56 μF
WCAP-ATLL Aluminum Electrolytic Capacitors , 56 μF; + / - 20%; 50 V , 8 x 11,5; Manufacturer: Wurth Elektronik; partNo: 860160674017; E-mail: libraries@we-online.com; Characteristics: Aluminum Electrolytic Capacitor;Recommended soldering: Wave;Operating temperature: –55 °C to +105 °C;Low impedance and high temperature product series;Load life: 3000–10000 h @ +105 °C; ComponentLink1Description: Manufacturer; ComponentLink1URL: http://www.we-online.com; ComponentLink2Description: Datasheet; ComponentLink2URL: http://katalog.we-online.de/pbs/datasheet/860160674017.pdf; Created by: Karrer Zheng; Created Date: 5/13/2015; Capacitance: 56 μF; Application: Used in circuit with rigorous conditions and high ambient temperature;  applied to the secondary side output filtering loop, used in switching power supply with higher operating temperature, DC-DC converter, AC-DC converter, adapter, charger, TV, VCR, DC motor circuit filter, high-end switching power supply, LCD TV, energy saving lamps, electronic ballast, LED lamp and etc.
footprint WCAP-ATLL 8x11.5x3.5x0.5
pins: 1, 2

## WCAP-ATLL 8x11.5x3.5x0.5 860160674018
designator C?, comment 68 μF
WCAP-ATLL Aluminum Electrolytic Capacitors , 68 μF; + / - 20%; 50 V , 8 x 11,5; Manufacturer: Wurth Elektronik; partNo: 860160674018; E-mail: libraries@we-online.com; Characteristics: Aluminum Electrolytic Capacitor;Recommended soldering: Wave;Operating temperature: –55 °C to +105 °C;Low impedance and high temperature product series;Load life: 3000–10000 h @ +105 °C; ComponentLink1Description: Manufacturer; ComponentLink1URL: http://www.we-online.com; ComponentLink2Description: Datasheet; ComponentLink2URL: http://katalog.we-online.de/pbs/datasheet/860160674018.pdf; Created by: Karrer Zheng; Created Date: 5/13/2015; Capacitance: 68 μF; Application: Used in circuit with rigorous conditions and high ambient temperature;  applied to the secondary side output filtering loop, used in switching power supply with higher operating temperature, DC-DC converter, AC-DC converter, adapter, charger, TV, VCR, DC motor circuit filter, high-end switching power supply, LCD TV, energy saving lamps, electronic ballast, LED lamp and etc.
footprint WCAP-ATLL 8x11.5x3.5x0.5
pins: 1, 2

## WCAP-ATLL 8x11.5x3.5x0.5 860160674020
designator C?, comment 82 μF
WCAP-ATLL Aluminum Electrolytic Capacitors , 82 μF; + / - 20%; 50 V , 8 x 11,5; Manufacturer: Wurth Elektronik; partNo: 860160674020; E-mail: libraries@we-online.com; Characteristics: Aluminum Electrolytic Capacitor;Recommended soldering: Wave;Operating temperature: –55 °C to +105 °C;Low impedance and high temperature product series;Load life: 3000–10000 h @ +105 °C; ComponentLink1Description: Manufacturer; ComponentLink1URL: http://www.we-online.com; ComponentLink2Description: Datasheet; ComponentLink2URL: http://katalog.we-online.de/pbs/datasheet/860160674020.pdf; Created by: Karrer Zheng; Created Date: 5/13/2015; Capacitance: 82 μF; Application: Used in circuit with rigorous conditions and high ambient temperature;  applied to the secondary side output filtering loop, used in switching power supply with higher operating temperature, DC-DC converter, AC-DC converter, adapter, charger, TV, VCR, DC motor circuit filter, high-end switching power supply, LCD TV, energy saving lamps, electronic ballast, LED lamp and etc.
footprint WCAP-ATLL 8x11.5x3.5x0.5
pins: 1, 2

## WCAP-ATLL 8x11.5x3.5x0.5 860160674021
designator C?, comment 100 μF
WCAP-ATLL Aluminum Electrolytic Capacitors , 100 μF; + / - 20%; 50 V , 8 x 11,5; Manufacturer: Wurth Elektronik; partNo: 860160674021; E-mail: libraries@we-online.com; Characteristics: Aluminum Electrolytic Capacitor;Recommended soldering: Wave;Operating temperature: –55 °C to +105 °C;Low impedance and high temperature product series;Load life: 3000–10000 h @ +105 °C; ComponentLink1Description: Manufacturer; ComponentLink1URL: http://www.we-online.com; ComponentLink2Description: Datasheet; ComponentLink2URL: http://katalog.we-online.de/pbs/datasheet/860160674021.pdf; Created by: Karrer Zheng; Created Date: 5/13/2015; Capacitance: 100 μF; Application: Used in circuit with rigorous conditions and high ambient temperature;  applied to the secondary side output filtering loop, used in switching power supply with higher operating temperature, DC-DC converter, AC-DC converter, adapter, charger, TV, VCR, DC motor circuit filter, high-end switching power supply, LCD TV, energy saving lamps, electronic ballast, LED lamp and etc.
footprint WCAP-ATLL 8x11.5x3.5x0.5
pins: 1, 2

## WCAP-ATLL 8x16x3.5x0.5 860160674022
designator C?, comment 120 μF
WCAP-ATLL Aluminum Electrolytic Capacitors , 120 μF; + / - 20%; 50 V , 8 x 16; Manufacturer: Wurth Elektronik; partNo: 860160674022; E-mail: libraries@we-online.com; Characteristics: Aluminum Electrolytic Capacitor;Recommended soldering: Wave;Operating temperature: –55 °C to +105 °C;Low impedance and high temperature product series;Load life: 3000–10000 h @ +105 °C; ComponentLink1Description: Manufacturer; ComponentLink1URL: http://www.we-online.com; ComponentLink2Description: Datasheet; ComponentLink2URL: http://katalog.we-online.de/pbs/datasheet/860160674022.pdf; Created by: Karrer Zheng; Created Date: 5/13/2015; Capacitance: 120 μF; Application: Used in circuit with rigorous conditions and high ambient temperature;  applied to the secondary side output filtering loop, used in switching power supply with higher operating temperature, DC-DC converter, AC-DC converter, adapter, charger, TV, VCR, DC motor circuit filter, high-end switching power supply, LCD TV, energy saving lamps, electronic ballast, LED lamp and etc.
footprint WCAP-ATLL 8x16x3.5x0.5
pins: 1, 2

## WCAP-ATLL 8x16x3.5x0.5 860160674023
designator C?, comment 150 μF
WCAP-ATLL Aluminum Electrolytic Capacitors , 150 μF; + / - 20%; 50 V , 8 x 16; Manufacturer: Wurth Elektronik; partNo: 860160674023; E-mail: libraries@we-online.com; Characteristics: Aluminum Electrolytic Capacitor;Recommended soldering: Wave;Operating temperature: –55 °C to +105 °C;Low impedance and high temperature product series;Load life: 3000–10000 h @ +105 °C; ComponentLink1Description: Manufacturer; ComponentLink1URL: http://www.we-online.com; ComponentLink2Description: Datasheet; ComponentLink2URL: http://katalog.we-online.de/pbs/datasheet/860160674023.pdf; Created by: Karrer Zheng; Created Date: 5/13/2015; Capacitance: 150 μF; Application: Used in circuit with rigorous conditions and high ambient temperature;  applied to the secondary side output filtering loop, used in switching power supply with higher operating temperature, DC-DC converter, AC-DC converter, adapter, charger, TV, VCR, DC motor circuit filter, high-end switching power supply, LCD TV, energy saving lamps, electronic ballast, LED lamp and etc.
footprint WCAP-ATLL 8x16x3.5x0.5
pins: 1, 2

## WCAP-ATLL 8x20x3.5x0.6 860160674024
designator C?, comment 180 μF
WCAP-ATLL Aluminum Electrolytic Capacitors , 180 μF; + / - 20%; 50 V , 8 x 20; Manufacturer: Wurth Elektronik; partNo: 860160674024; E-mail: libraries@we-online.com; Characteristics: Aluminum Electrolytic Capacitor;Recommended soldering: Wave;Operating temperature: –55 °C to +105 °C;Low impedance and high temperature product series;Load life: 3000–10000 h @ +105 °C; ComponentLink1Description: Manufacturer; ComponentLink1URL: http://www.we-online.com; ComponentLink2Description: Datasheet; ComponentLink2URL: http://katalog.we-online.de/pbs/datasheet/860160674024.pdf; Created by: Karrer Zheng; Created Date: 5/13/2015; Capacitance: 180 μF; Application: Used in circuit with rigorous conditions and high ambient temperature;  applied to the secondary side output filtering loop, used in switching power supply with higher operating temperature, DC-DC converter, AC-DC converter, adapter, charger, TV, VCR, DC motor circuit filter, high-end switching power supply, LCD TV, energy saving lamps, electronic ballast, LED lamp and etc.
footprint WCAP-ATLL 8x20x3.5x0.6
pins: 1, 2

## WCAP-ATLL 10x16x5x0.6 860160675025
designator C?, comment 180 μF
WCAP-ATLL Aluminum Electrolytic Capacitors , 180 μF; + / - 20%; 50 V , 10 x 16; Manufacturer: Wurth Elektronik; partNo: 860160675025; E-mail: libraries@we-online.com; Characteristics: Aluminum Electrolytic Capacitor;Recommended soldering: Wave;Operating temperature: –55 °C to +105 °C;Low impedance and high temperature product series;Load life: 3000–10000 h @ +105 °C; ComponentLink1Description: Manufacturer; ComponentLink1URL: http://www.we-online.com; ComponentLink2Description: Datasheet; ComponentLink2URL: http://katalog.we-online.de/pbs/datasheet/860160675025.pdf; Created by: Karrer Zheng; Created Date: 5/13/2015; Capacitance: 180 μF; Application: Used in circuit with rigorous conditions and high ambient temperature;  applied to the secondary side output filtering loop, used in switching power supply with higher operating temperature, DC-DC converter, AC-DC converter, adapter, charger, TV, VCR, DC motor circuit filter, high-end switching power supply, LCD TV, energy saving lamps, electronic ballast, LED lamp and etc.
footprint WCAP-ATLL 10x16x5x0.6
pins: 1, 2

## WCAP-ATLL 10x16x5x0.6 860160675026
designator C?, comment 220 μF
WCAP-ATLL Aluminum Electrolytic Capacitors , 220 μF; + / - 20%; 50 V , 10 x 16; Manufacturer: Wurth Elektronik; partNo: 860160675026; E-mail: libraries@we-online.com; Characteristics: Aluminum Electrolytic Capacitor;Recommended soldering: Wave;Operating temperature: –55 °C to +105 °C;Low impedance and high temperature product series;Load life: 3000–10000 h @ +105 °C; ComponentLink1Description: Manufacturer; ComponentLink1URL: http://www.we-online.com; ComponentLink2Description: Datasheet; ComponentLink2URL: http://katalog.we-online.de/pbs/datasheet/860160675026.pdf; Created by: Karrer Zheng; Created Date: 5/13/2015; Capacitance: 220 μF; Application: Used in circuit with rigorous conditions and high ambient temperature;  applied to the secondary side output filtering loop, used in switching power supply with higher operating temperature, DC-DC converter, AC-DC converter, adapter, charger, TV, VCR, DC motor circuit filter, high-end switching power supply, LCD TV, energy saving lamps, electronic ballast, LED lamp and etc.
footprint WCAP-ATLL 10x16x5x0.6
pins: 1, 2

## WCAP-ATLL 10x20x5x0.6 860160675027
designator C?, comment 270 μF
WCAP-ATLL Aluminum Electrolytic Capacitors , 270 μF; + / - 20%; 50 V , 10 x 20; Manufacturer: Wurth Elektronik; partNo: 860160675027; E-mail: libraries@we-online.com; Characteristics: Aluminum Electrolytic Capacitor;Recommended soldering: Wave;Operating temperature: –55 °C to +105 °C;Low impedance and high temperature product series;Load life: 3000–10000 h @ +105 °C; ComponentLink1Description: Manufacturer; ComponentLink1URL: http://www.we-online.com; ComponentLink2Description: Datasheet; ComponentLink2URL: http://katalog.we-online.de/pbs/datasheet/860160675027.pdf; Created by: Karrer Zheng; Created Date: 5/13/2015; Capacitance: 270 μF; Application: Used in circuit with rigorous conditions and high ambient temperature;  applied to the secondary side output filtering loop, used in switching power supply with higher operating temperature, DC-DC converter, AC-DC converter, adapter, charger, TV, VCR, DC motor circuit filter, high-end switching power supply, LCD TV, energy saving lamps, electronic ballast, LED lamp and etc.
footprint WCAP-ATLL 10x20x5x0.6
pins: 1, 2

## WCAP-ATLL 10x25x5x0.6 860160675028
designator C?, comment 330 μF
WCAP-ATLL Aluminum Electrolytic Capacitors , 330 μF; + / - 20%; 50 V , 10 x 25; Manufacturer: Wurth Elektronik; partNo: 860160675028; E-mail: libraries@we-online.com; Characteristics: Aluminum Electrolytic Capacitor;Recommended soldering: Wave;Operating temperature: –55 °C to +105 °C;Low impedance and high temperature product series;Load life: 3000–10000 h @ +105 °C; ComponentLink1Description: Manufacturer; ComponentLink1URL: http://www.we-online.com; ComponentLink2Description: Datasheet; ComponentLink2URL: http://katalog.we-online.de/pbs/datasheet/860160675028.pdf; Created by: Karrer Zheng; Created Date: 5/13/2015; Capacitance: 330 μF; Application: Used in circuit with rigorous conditions and high ambient temperature;  applied to the secondary side output filtering loop, used in switching power supply with higher operating temperature, DC-DC converter, AC-DC converter, adapter, charger, TV, VCR, DC motor circuit filter, high-end switching power supply, LCD TV, energy saving lamps, electronic ballast, LED lamp and etc.
footprint WCAP-ATLL 10x25x5x0.6
pins: 1, 2

## WCAP-ATLL 13x20x5x0.6 860160678029
designator C?, comment 330 μF
WCAP-ATLL Aluminum Electrolytic Capacitors , 330 μF; + / - 20%; 50 V , 13 x 20; Manufacturer: Wurth Elektronik; partNo: 860160678029; E-mail: libraries@we-online.com; Characteristics: Aluminum Electrolytic Capacitor;Recommended soldering: Wave;Operating temperature: –55 °C to +105 °C;Low impedance and high temperature product series;Load life: 3000–10000 h @ +105 °C; ComponentLink1Description: Manufacturer; ComponentLink1URL: http://www.we-online.com; ComponentLink2Description: Datasheet; ComponentLink2URL: http://katalog.we-online.de/pbs/datasheet/860160678029.pdf; Created by: Karrer Zheng; Created Date: 5/13/2015; Capacitance: 330 μF; Application: Used in circuit with rigorous conditions and high ambient temperature;  applied to the secondary side output filtering loop, used in switching power supply with higher operating temperature, DC-DC converter, AC-DC converter, adapter, charger, TV, VCR, DC motor circuit filter, high-end switching power supply, LCD TV, energy saving lamps, electronic ballast, LED lamp and etc.
footprint WCAP-ATLL 13x20x5x0.6
pins: 1, 2

## WCAP-ATLL 13x20x5x0.6 860160678030
designator C?, comment 470 μF
WCAP-ATLL Aluminum Electrolytic Capacitors , 470 μF; + / - 20%; 50 V , 13 x 20; Manufacturer: Wurth Elektronik; partNo: 860160678030; E-mail: libraries@we-online.com; Characteristics: Aluminum Electrolytic Capacitor;Recommended soldering: Wave;Operating temperature: –55 °C to +105 °C;Low impedance and high temperature product series;Load life: 3000–10000 h @ +105 °C; ComponentLink1Description: Manufacturer; ComponentLink1URL: http://www.we-online.com; ComponentLink2Description: Datasheet; ComponentLink2URL: http://katalog.we-online.de/pbs/datasheet/860160678030.pdf; Created by: Karrer Zheng; Created Date: 5/13/2015; Capacitance: 470 μF; Application: Used in circuit with rigorous conditions and high ambient temperature;  applied to the secondary side output filtering loop, used in switching power supply with higher operating temperature, DC-DC converter, AC-DC converter, adapter, charger, TV, VCR, DC motor circuit filter, high-end switching power supply, LCD TV, energy saving lamps, electronic ballast, LED lamp and etc.
footprint WCAP-ATLL 13x20x5x0.6
pins: 1, 2

## WCAP-ATLL 13x20x5x0.6 860160678031
designator C?, comment 560 μF
WCAP-ATLL Aluminum Electrolytic Capacitors , 560 μF; + / - 20%; 50 V , 13 x 20; Manufacturer: Wurth Elektronik; partNo: 860160678031; E-mail: libraries@we-online.com; Characteristics: Aluminum Electrolytic Capacitor;Recommended soldering: Wave;Operating temperature: –55 °C to +105 °C;Low impedance and high temperature product series;Load life: 3000–10000 h @ +105 °C; ComponentLink1Description: Manufacturer; ComponentLink1URL: http://www.we-online.com; ComponentLink2Description: Datasheet; ComponentLink2URL: http://katalog.we-online.de/pbs/datasheet/860160678031.pdf; Created by: Karrer Zheng; Created Date: 5/13/2015; Capacitance: 560 μF; Application: Used in circuit with rigorous conditions and high ambient temperature;  applied to the secondary side output filtering loop, used in switching power supply with higher operating temperature, DC-DC converter, AC-DC converter, adapter, charger, TV, VCR, DC motor circuit filter, high-end switching power supply, LCD TV, energy saving lamps, electronic ballast, LED lamp and etc.
footprint WCAP-ATLL 13x20x5x0.6
pins: 1, 2